# Altium footprint library ComplexCurcuit.PcbLib: 36 footprints (part 3 of 3)
Each footprint in its own frame and in the unit in brackets; x right, y up, seen from the top. Pads: shape width x height; smd on the part's side, far side on the other; paste and mask are expansions set on the pad; w line width, h text height; cw(c..) or ccw(c..) is an arc to the next point about the centre after c.
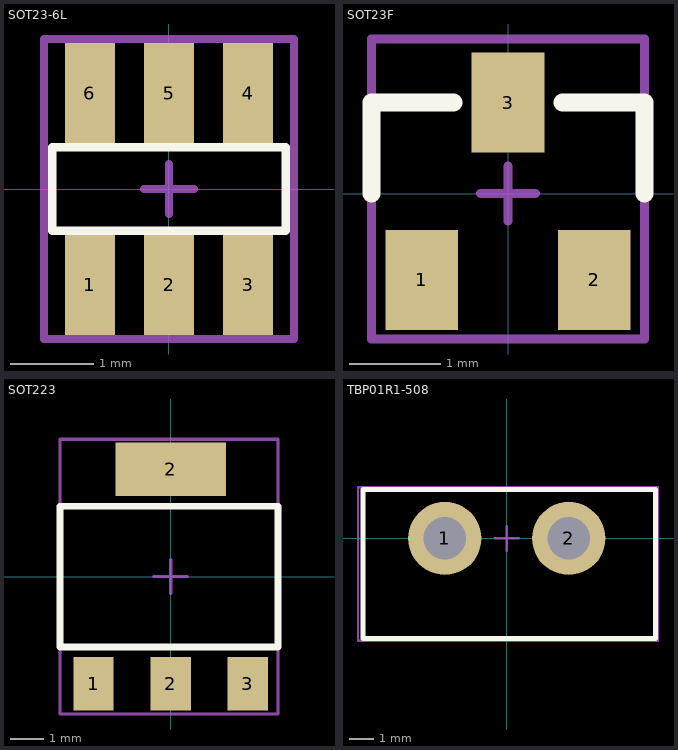
[diagram p2: the footprints below, top view; thin cyan lines are the x and y axes]

## SOT23-6L [mm]
pads (6):
  rect 0.6x1.2 smd mask+0.05: 1(-0.95,-1.15) 2(0,-1.15) 3(0.95,-1.15) 4(0.95,1.15) 5(0,1.15) 6(-0.95,1.15)
Top Overlay:
  lines w0.1: -1.4,-0.5 1.4,-0.5 1.4,0.5 -1.4,0.5 -1.4,-0.5
Top Component Center:
  lines w0.1: -0.3,0 0.3,0 ; 0,-0.3 0,0.3 ; -1.5,-1.8 -1.5,1.8 1.5,1.8 1.5,-1.8 -1.5,-1.8
Top Designator:
  lines w0.1: -1.5,-1.8 1.5,-1.8 1.5,1.8 -1.5,1.8 -1.5,-1.8
  text ".Designator" at -0.8,-0.05 h0.75
3D body "SOT23-6.STEP": height 1.2, standoff 0.1, extent -1.45,-1.392 1.45,1.392

## SOT23F [mm]
pads (3):
  rect 0.8x1.1 smd mask+0.05: 1(-0.95,-0.95) 2(0.95,-0.95) 3(0,1)
Top Overlay:
  lines w0.2: -1.5,0 -1.5,1 -0.6,1 ; 0.6,1 1.5,1 1.5,0
Top Component Center:
  lines w0.1: -0.3,0 0.3,0 ; 0,-0.3 0,0.3 ; -1.5,-1.6 1.5,-1.6 1.5,1.7 -1.5,1.7 -1.5,-1.6
Top Designator:
  lines w0.1: -1.5,-1.6 1.5,-1.6 1.5,1.7 -1.5,1.7 -1.5,-1.6
  text ".Designator" at -1,-0.133 h0.5
3D body "SOT23-3.stp": height 1.2, standoff 0.02, extent -1.5,-1.418 1.5,1.418

## SOT223 [mm] "Linear Voltage Regulator IC Positive Fixed 1 Output 1A SOT-223-3"
pads (4):
  rect 1.2x1.6 smd mask+0.05: 1(-2.3,-3.2) 2(0,-3.2) 3(2.3,-3.2)
  rect 3.3x1.6 smd mask+0.05: 2(0,3.2)
Top Overlay:
  lines w0.2: -3.3,-2.1 3.2,-2.1 3.2,2.1 1.275,2.1 -1.375,2.1 -3.3,2.1 -3.3,-2.1
Top Component Center:
  lines w0.1: -0.5,0 0.5,0 ; 0,-0.5 0,0.5 ; -3.3,-4.1 3.2,-4.1 3.2,4.1 -3.3,4.1 -3.3,-4.1
Top Designator:
  lines w0.1: -3.3,-4.1 -3.3,4.1 3.2,4.1 3.2,-4.1 -3.3,-4.1
  text ".Designator" at -2.6,-1.067 h1
3D body "CircuitWorks-SOT-223.step": height 1.7, standoff 0.02, extent -3.25,-3.18 3.25,3.78

## TBP01R1-508 [mm]
pads (2):
  round 3 hole 1.75 mask+0.05: 1(-2.54,0) 2(2.54,0)
Top Overlay:
  lines w0.2: -5.9,-4.1 -5.9,2 6.1,2 6.1,-4 6.1,-4.1 -5.9,-4.1
Top Component Center:
  lines w0.1: -0.5,0 0.5,0 ; 0,-0.5 0,0.5 ; -6.1,-4.2 -6.1,2.1 6.2,2.1 6.2,0.525 6.2,-2.625 6.2,-4.2 -6.1,-4.2
Top Designator:
  lines w0.1: -6.1,-4.2 6.2,-4.2 6.2,-2.625 6.2,0.525 6.2,2.1 -6.1,2.1 -6.1,-4.2
  text ".Designator" at -2.5,-2.433 h0.8
3D body "CUI_DEVICES_TBP01R1-508-02BE.step": height 8.6, standoff -3.9, extent -5.8,-10.1 5.96,1.9